# Altium footprint library EMDC_Packages.PcbLib: 274 footprints (part 13 of 18)
Each footprint in its own frame and in the unit in brackets; x right, y up, seen from the top. Pads: shape width x height; smd on the part's side, far side on the other; paste and mask are expansions set on the pad; w line width, h text height; cw(c..) or ccw(c..) is an arc to the next point about the centre after c.
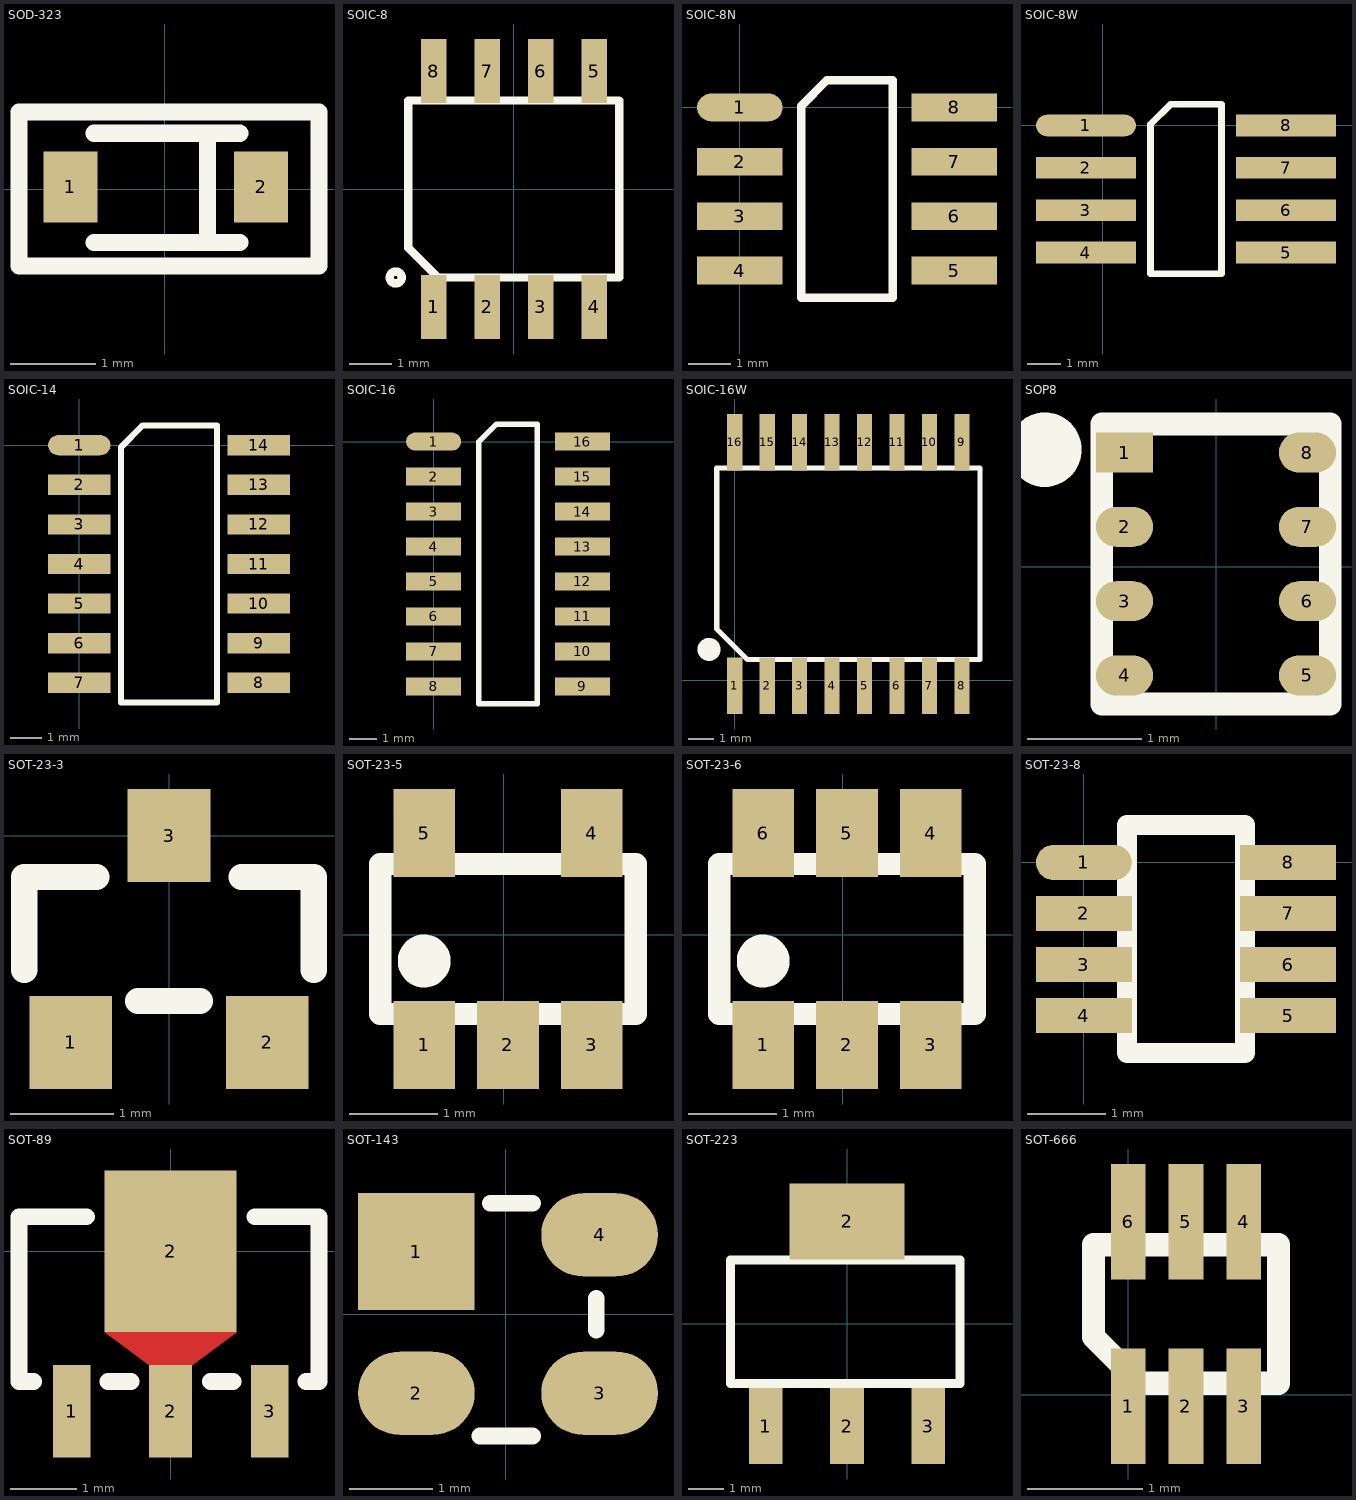
[diagram p12: the footprints below, top view; thin cyan lines are the x and y axes]

## SOD-323 [mm]
pads (2):
  rect 0.63x0.83 smd: 1(-1.1,0.025) 2(1.125,0.025)
Top Overlay:
  lines w0.2: -0.825,-0.625 0.875,-0.625 ; -0.825,0.65 0.875,0.65 ; 0.5,-0.625 0.5,0.65 ; -1.7,-0.9 1.8,-0.9 1.8,0.9 -1.7,0.9 -1.7,-0.9
3D body "SW3dPS-SOD-323.STEP": height 1.1, standoff 0, extent -1.3,-0.675 1.3,0.675

## SOIC-8 [mm]
pads (8):
  rect 0.6x1.52 smd: 1(-1.9,-2.8) 2(-0.63,-2.8) 3(0.64,-2.8) 4(1.91,-2.8) 5(1.91,2.8) 6(0.64,2.8) 7(-0.63,2.8) 8(-1.9,2.8)
Top Overlay:
  circle w0.2: c-2.8,-2.1 r0.141
  lines w0.2: -2.5,-1.4 -1.8,-2.1 2.5,-2.1 2.5,2.1 -2.5,2.1 -2.5,-1.4
3D body "User Library-so8-3.step": height 1.7, standoff 0, extent -2.45,-3 2.45,3

## SOIC-8N [mm]
pads (8):
  oval 2x0.65 smd: 1(0,0)
  rect 2x0.65 smd: 2(0,-1.27) 3(0,-2.54) 4(0,-3.81) 5(5,-3.81) 6(5,-2.54) 7(5,-1.27) 8(5,0)
Top Overlay:
  lines w0.2: 1.435,-4.445 3.565,-4.445 3.565,0.635 2.032,0.635 1.435,0.038 1.435,-4.445
3D body "User Library-soic-8.STEP": height 1.65, standoff -0.09, extent -0.601,-4.425 5.601,0.575

## SOIC-8W [mm] "Wide"
pads (8):
  oval 3x0.65 smd: 1(-0.5,0)
  rect 3x0.65 smd: 2(-0.5,-1.27) 3(-0.5,-2.54) 4(-0.5,-3.81) 5(5.5,-3.81) 6(5.5,-2.54) 7(5.5,-1.27) 8(5.5,0)
Top Overlay:
  lines w0.2: 1.435,-4.445 1.435,0.038 2.032,0.635 3.565,0.635 3.565,-4.445 1.435,-4.445
3D body "User Library-SOIC8_Wide_5mmx5mm.STEP": height 1.75, standoff -0.01, extent -1.552,-4.63 6.55,0.83

## SOIC-14 [mm]
pads (14):
  oval 2x0.65 smd: 1(0,0)
  rect 2x0.65 smd: 2(0,-1.27) 3(0,-2.54) 4(0,-3.81) 5(0,-5.08) 6(0,-6.35) 7(0,-7.62) 8(5.75,-7.62) 9(5.75,-6.35) 10(5.75,-5.08) 11(5.75,-3.81) 12(5.75,-2.54) 13(5.75,-1.27) 14(5.75,0)
Top Overlay:
  lines w0.2: 1.335,-8.255 1.335,-0.062 2.032,0.635 4.415,0.635 4.415,-8.255 1.335,-8.255
3D body "User Library-SOIC-14.STEP": height 1.75, standoff 0, extent -0.125,-8.175 5.875,0.575

## SOIC-16 [mm] "SOIC16"
height 1.75
pads (16):
  oval 2x0.65 smd: 1(0,0)
  rect 2x0.65 smd: 2(0,-1.27) 3(0,-2.54) 4(0,-3.81) 5(0,-5.08) 6(0,-6.35) 7(0,-7.62) 8(0,-8.89) 9(5.4,-8.89) 10(5.4,-7.62) 11(5.4,-6.35) 12(5.4,-5.08) 13(5.4,-3.81) 14(5.4,-2.54) 15(5.4,-1.27) 16(5.4,0)
Top Overlay:
  lines w0.2: 1.635,-9.525 3.765,-9.525 3.765,0.635 2.286,0.635 1.635,-0.016 1.635,-9.525
3D body "User Library-SOIC-16-1.STEP": height 1.4, standoff 0, extent -0.375,-9.375 5.625,0.525

## SOIC-16W [mm]
pads (16):
  rect 0.6x2.2 smd: 1(0,-0.225) 2(1.27,-0.225) 3(2.54,-0.225) 4(3.81,-0.225) 5(5.08,-0.225) 6(6.35,-0.225) 7(7.62,-0.225) 8(8.89,-0.225) 9(8.89,9.305) 10(7.62,9.305) 11(6.35,9.305) 12(5.08,9.305) 13(3.81,9.305) 14(2.54,9.305) 15(1.27,9.305) 16(0,9.305)
Top Overlay:
  circle w0.5: c-1,1.2 r0.2
  lines w0.2: -0.7,2 0.5,0.8 9.6,0.8 9.6,8.3 -0.7,8.3 -0.7,2
3D body "User Library-SOIC16_Wide_JEDEC_MS-013AA.step": height 2.62, standoff -0.03, extent -0.8,-0.69 9.7,9.94

## SOP8 [mm]
pads (8):
  rect 0.5x0.35 smd: 1(-0.8,1)
  oval 0.5x0.35 smd: 2(-0.8,0.35) 3(-0.8,-0.3) 4(-0.8,-0.95) 5(0.8,-0.95) 6(0.8,-0.3) 7(0.8,0.35) 8(0.8,1)
Top Overlay:
  circle w0.5: c-1.5,1.025 r0.075
  lines w0.2: -1,-1.2 -1,1.25 1,1.25 1,-1.2 -1,-1.2
3D body: height 1, standoff 0.13, extent -0.875,-1.1 0.875,1.15
3D body: height 0.13, standoff 0, extent -1,-1.225 1,1.275

## SOT-23-3 [mm]
pads (3):
  rect 0.8x0.9 smd: 1(-0.95,-2) 2(0.95,-2) 3(0,0)
Top Overlay:
  lines w0.254: -1.4,-1.3 -1.4,-0.4 -0.7,-0.4 ; -0.3,-1.6 0.3,-1.6 ; 0.7,-0.4 1.4,-0.4 1.4,-1.3
3D body "User Library-SOT-23-2.STEP": height 1.08, standoff 0, extent -1.5,-2.32 1.5,0.32

## SOT-23-5 [mm]
pads (5):
  rect 0.7x1 smd: 1(-0.9,-1.25) 2(0.05,-1.25) 3(1,-1.25) 4(1,1.15) 5(-0.9,1.15)
Top Overlay:
  circle w0.3: c-0.9,-0.3 r0.15
  lines w0.254: -1.4,-0.9 1.5,-0.9 1.5,0.8 -1.4,0.8 -1.4,-0.9
3D body "User Library-SOT23-5-1.STEP": height 1.3, standoff 0, extent -1.5,-1.5 1.5,1.5

## SOT-23-6 [mm]
pads (6):
  rect 0.7x1 smd: 1(-0.9,-1.25) 2(0.05,-1.25) 3(1,-1.25) 4(1,1.15) 5(0.05,1.15) 6(-0.9,1.15)
Top Overlay:
  circle w0.3: c-0.9,-0.3 r0.15
  lines w0.254: -1.4,-0.9 -1.4,0.8 1.5,0.8 1.5,-0.9 -1.4,-0.9
3D body "User Library-SOT23-6-2.STEP": height 1.45, standoff 0, extent -1.45,-1.4 1.45,1.4

## SOT-23-8 [mm]
pads (8):
  oval 1.22x0.45 smd: 1(0,0)
  rect 1.22x0.45 smd: 2(0,-0.65) 3(0,-1.3) 4(0,-1.95) 5(2.6,-1.95) 6(2.6,-1.3) 7(2.6,-0.65) 8(2.6,0)
Top Overlay:
  lines w0.254: 0.55,-2.425 0.55,0.475 2.05,0.475 2.05,-2.425 0.55,-2.425
3D body "User Library-TSOT-23-8.STEP": height 1, standoff 0, extent -0.15,-2.45 2.65,0.45

## SOT-89 [mm]
pads (4):
  rect 0.57x1.4 smd: 1(-1.5,-2.425) 3(1.5,-2.425)
  rect 0.65x1.4 smd: 2(0,-2.425)
  rect 2x2.45 smd: 2(0,0)
Top Layer:
  region: 0.325,-1.725 1,-1.225 -1,-1.225 -0.325,-1.725
Top Overlay:
  lines w0.254: -2.075,-1.975 -2.3,-1.975 -2.3,0.525 -1.275,0.525 ; -0.95,-1.975 -0.6,-1.975 ; 0.6,-1.975 0.95,-1.975 ; 1.275,0.525 2.25,0.525 2.25,-1.975 2.05,-1.975
Top Solder:
  region: -1.1,-1.325 -0.425,-1.825 0.425,-1.825 1.1,-1.325
3D body "SW3dPS-SOT89.STEP": height 1.59, standoff -0.02, extent -2.315,-3.058 2.286,1.192

## SOT-143 [mm]
pads (4):
  rect 1.4x1.4 smd: 1(-1.075,0.75)
  oval 1.4x1 smd: 2(-1.075,-0.95) 3(1.125,-0.95) 4(1.125,0.95)
Top Overlay:
  lines w0.2: -0.313,-1.463 0.322,-1.463 ; -0.186,1.331 0.322,1.331 ; 1.084,-0.193 1.084,0.188
3D body "User Library-sot143.STEP": height 1, standoff 0, extent -1.41,-1.135 1.51,1.285

## SOT-223 [mm]
pads (4):
  rect 0.95x2.15 smd: 1(-2.3,-2.9) 2(0,-2.9) 3(2.3,-2.9)
  rect 3.25x2.15 smd: 2(0,2.9)
Top Overlay:
  lines w0.254: -3.3,-1.7 3.2,-1.7 3.2,1.8 -3.3,1.8 -3.3,-1.7
3D body "User Library-SOT223-3.STEP": height 1.7, standoff 0, extent -3.25,-3.5 3.25,3.5

## SOT-666 [mm]
pads (6):
  rect 0.3x1 smd: 1(0,-0.1) 2(0.5,-0.1) 3(1,-0.1) 4(1,1.5) 5(0.5,1.5) 6(0,1.5)
Top Overlay:
  lines w0.2: -0.3,0.5 0.1,0.1 1.3,0.1 1.3,1.3 -0.3,1.3 -0.3,0.5
3D body "User Library-SOT50P160X60-6.STEP": height 0.6, standoff 0, extent -0.295,-0.1 1.295,1.5